# Altium footprint library Elettronica FM.PcbLib: 387 footprints (part 21 of 25)
Each footprint in its own frame and in the unit in brackets; x right, y up, seen from the top. Pads: shape width x height; smd on the part's side, far side on the other; paste and mask are expansions set on the pad; w line width, h text height; cw(c..) or ccw(c..) is an arc to the next point about the centre after c.
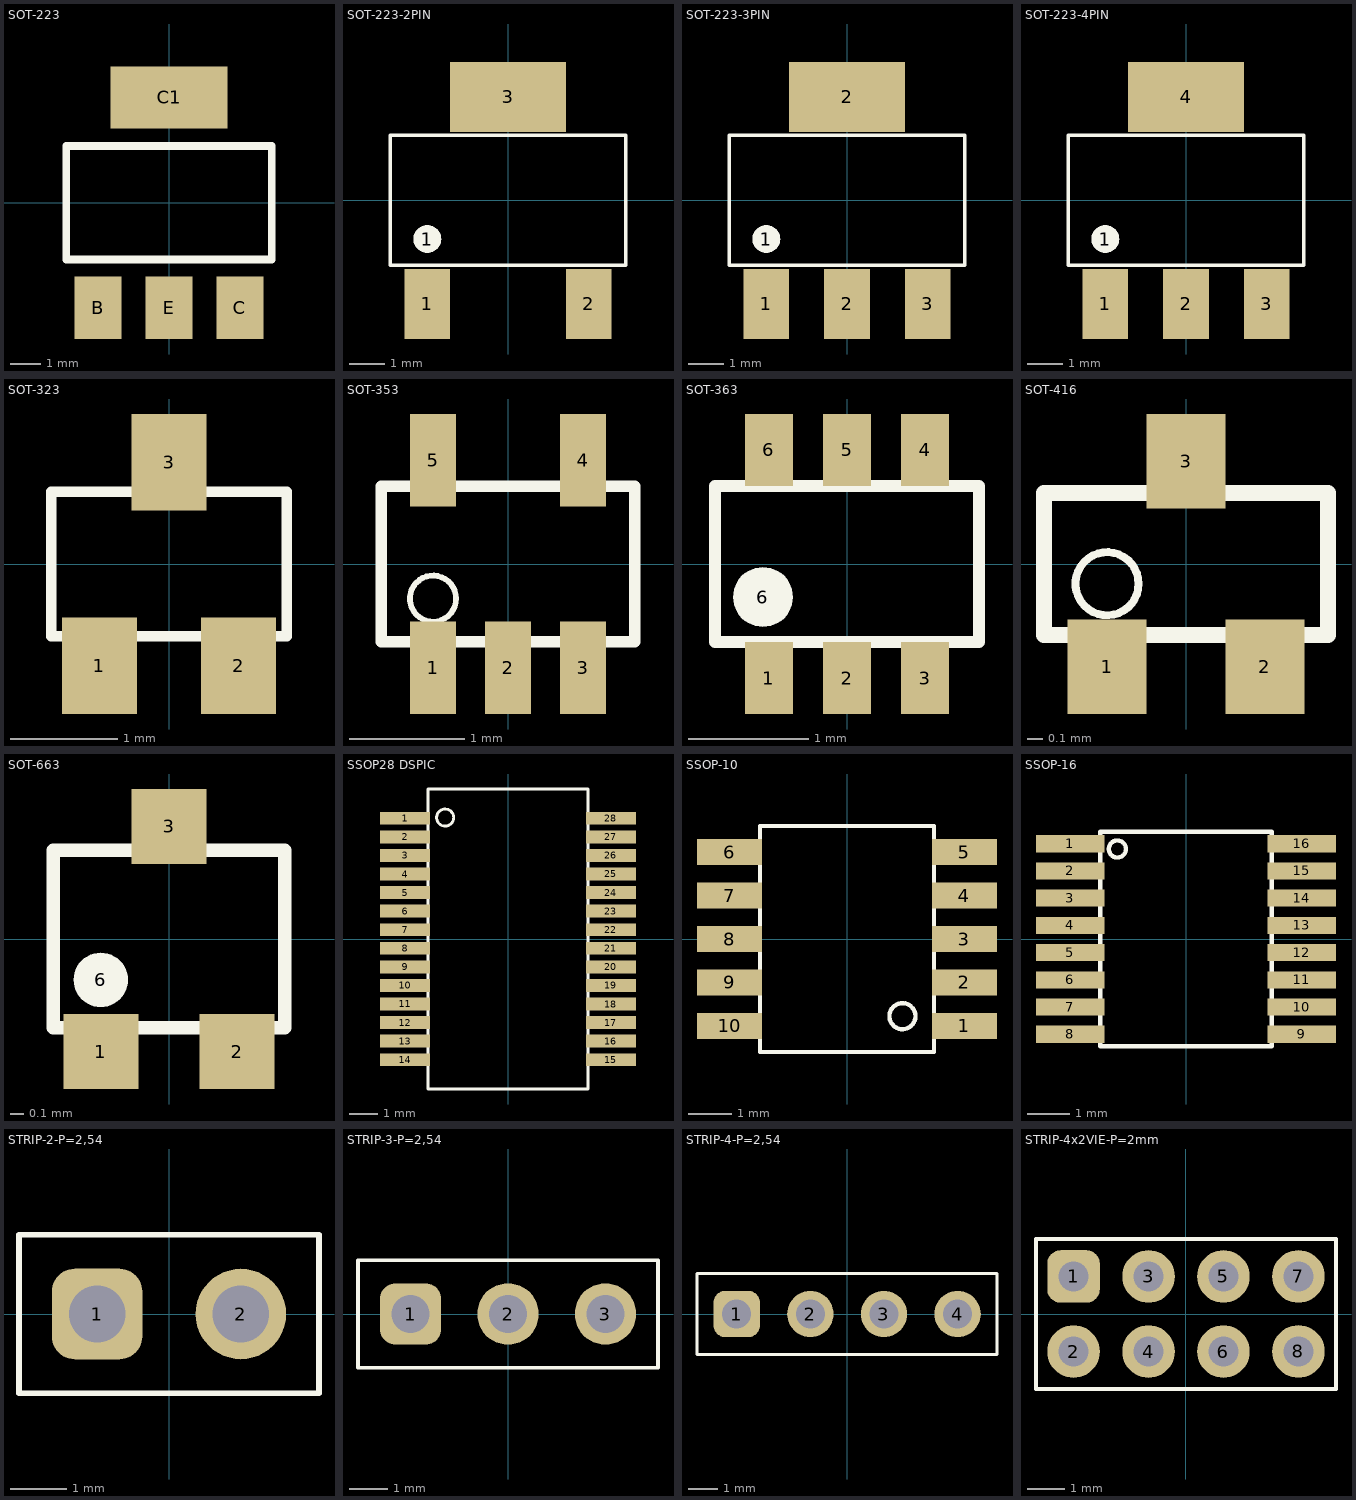
[diagram p20: the footprints below, top view; thin cyan lines are the x and y axes]

## SOT-223 [mil]
pads (4):
  rect 60x80 smd: B(-91,-135) C(91,-135) E(0,-135)
  rect 150x80 smd: C1(0,135)
Top Overlay:
  lines w10: -131.89,-72.83 131.89,-72.83 131.89,72.83 -131.89,72.83 -131.89,-72.83

## SOT-223-2PIN [mm]
pads (4):
  rect 1.3x2 smd: 1(-2.3,-2.95) 2(2.3,-2.95)
  round 0.8 on Top Overlay mask+0.1: 1(-2.3,-1.1)
  rect 3.3x2 smd: 3(0,2.95)
Top Overlay:
  lines w0.1: -3.35,-1.85 -3.35,1.85 3.35,1.85 3.35,-1.85 -3.35,-1.85
3D body: height 1.8, standoff 0, extent -3.35,-1.85 3.35,1.85

## SOT-223-3PIN [mm]
pads (5):
  rect 1.3x2 smd: 1(-2.3,-2.95) 2(0,-2.95) 3(2.3,-2.95)
  round 0.8 on Top Overlay mask+0.1: 1(-2.3,-1.1)
  rect 3.3x2 smd: 2(0,2.95)
Top Overlay:
  lines w0.1: -3.35,-1.85 3.35,-1.85 3.35,1.85 -3.35,1.85 -3.35,-1.85
3D body: height 1.8, standoff 0, extent -3.35,-1.85 3.35,1.85

## SOT-223-4PIN [mm]
pads (5):
  rect 1.3x2 smd: 1(-2.3,-2.95) 2(0,-2.95) 3(2.3,-2.95)
  round 0.8 on Top Overlay mask+0.1: 1(-2.3,-1.1)
  rect 3.3x2 smd: 4(0,2.95)
Top Overlay:
  lines w0.1: -3.35,-1.85 3.35,-1.85 3.35,1.85 -3.35,1.85 -3.35,-1.85
3D body: height 1.8, standoff 0, extent -3.35,-1.85 3.35,1.85

## SOT-323 [mm]
height 40.5
pads (3):
  rect 0.7x0.9 smd paste-0.05: 1(-0.65,-0.95) 2(0.65,-0.95) 3(0,0.95)
Top Overlay:
  lines w0.1: -1.1,-0.675 -1.1,0.675 1.1,0.675 1.1,-0.675 -1.1,-0.675
3D body "SOT323 (SC70-3).stp": height 1.1, standoff 0, extent -1.1,-1.123 1.1,1.123

## SOT-353 [mm]
pads (5):
  rect 0.4x0.8 smd: 1(-0.65,-0.9) 2(0,-0.9) 3(0.65,-0.9) 4(0.65,0.9) 5(-0.65,0.9)
Top Overlay:
  circle w0.05: c-0.65,-0.3 r0.2
  lines w0.1: -1.1,-0.675 1.1,-0.675 1.1,0.675 -1.1,0.675 -1.1,-0.675
3D body: height 1.1, standoff 0, extent -1.1,-0.675 1.1,0.675

## SOT-363 [mm]
pads (7):
  rect 0.4x0.6 smd: 1(-0.65,-0.95) 2(0,-0.95) 3(0.65,-0.95) 4(0.65,0.95) 5(0,0.95) 6(-0.65,0.95)
  round 0.5 on Top Overlay mask+0.1: 6(-0.7,-0.275)
Top Overlay:
  lines w0.1: -1.1,-0.65 -1.1,0.65 1.1,0.65 1.1,-0.65 -1.1,-0.65
3D body: height 1.1, standoff 0, extent -1.1,-0.65 1.1,0.65

## SOT-416 [mm]
pads (3):
  rect 0.5x0.6 smd: 1(-0.5,-0.65) 2(0.5,-0.65) 3(0,0.65)
Top Overlay:
  circle w0.05: c-0.5,-0.125 r0.2
  lines w0.1: -0.9,-0.45 0.9,-0.45 0.9,0.45 -0.9,0.45 -0.9,-0.45

## SOT-663 [mm]
pads (4):
  rect 0.55x0.55 smd: 1(-0.5,-0.825) 2(0.5,-0.825) 3(0,0.825)
  round 0.4 on Top Overlay mask+0.1: 6(-0.5,-0.3)
Top Overlay:
  lines w0.1: -0.85,-0.65 -0.85,0.65 0.85,0.65 0.85,-0.65 -0.85,-0.65
3D body: height 0.6, standoff 0, extent -0.85,-0.65 0.85,0.65

## SSOP28 DSPIC [mm]
height 1.85
pads (28):
  rect 1.75x0.45 smd paste-0.05: 1(-3.6,4.225) 2(-3.6,3.575) 3(-3.6,2.925) 4(-3.6,2.275) 5(-3.6,1.625) 6(-3.6,0.975) 7(-3.6,0.325) 8(-3.6,-0.325) 9(-3.6,-0.975) 10(-3.6,-1.625) 11(-3.6,-2.275) 12(-3.6,-2.925) 13(-3.6,-3.575) 14(-3.6,-4.225) 15(3.6,-4.225) 16(3.6,-3.575) 17(3.6,-2.925) 18(3.6,-2.275) 19(3.6,-1.625) 20(3.6,-0.975) 21(3.6,-0.325) 22(3.6,0.325) 23(3.6,0.975) 24(3.6,1.625) 25(3.6,2.275) 26(3.6,2.925) 27(3.6,3.575) 28(3.6,4.225)
Top Overlay:
  circle w0.1: c-2.2,4.25 r0.3
  lines w0.1: -2.8,-5.25 -2.8,5.25 2.8,5.25 2.8,-5.25 -2.8,-5.25
3D body: height 2, standoff 0, extent -2.8,-5.25 2.8,5.25

## SSOP-10 [mm] "SOP, 10-Leads, Body 5,0x4,0mm (max), Pitch 1,00mm, IPC High Density"
height 1.75
pads (10):
  rect 1.5x0.6 smd paste-0.05: 1(2.7,-2) 2(2.7,-1) 3(2.7,0) 4(2.7,1) 5(2.7,2) 6(-2.7,2) 7(-2.7,1) 8(-2.7,0) 9(-2.7,-1) 10(-2.7,-2)
Top Overlay:
  circle w0.1: c1.275,-1.775 r0.3
  lines w0.1: -2,-2.6 2,-2.6 2,2.6 -2,2.6 -2,-2.6
3D body: height 1.8, standoff 0, extent 0.975,-2.075 1.573,-1.476
3D body: height 1.75, standoff 0, extent -2,-2.6 2,2.6
3D body "SOP100P600X175-10.STEP": height 1.75, standoff 0.01, extent -3,-2.413 3,2.487

## SSOP-16 [mm]
pads (16):
  rect 1.6x0.4 smd mask+0.05: 1(-2.7,2.222) 2(-2.7,1.587) 3(-2.7,0.953) 4(-2.7,0.318) 5(-2.7,-0.318) 6(-2.7,-0.953) 7(-2.7,-1.587) 8(-2.7,-2.222) 9(2.7,-2.222) 10(2.7,-1.587) 11(2.7,-0.953) 12(2.7,-0.318) 13(2.7,0.318) 14(2.7,0.953) 15(2.7,1.587) 16(2.7,2.222)
Top Overlay:
  circle w0.1: c-1.6,2.1 r0.2
  lines w0.1: -2,-2.5 -2,2.5 2,2.5 2,-2.5 -2,-2.5
3D body: height 1.75, standoff 0, extent -2,-2.5 2,2.5

## STRIP-2-P=2,54 [mm]
pads (2):
  rrect50% 1.6x1.6 hole 1: 1(-1.27,0)
  round 1.6 hole 1: 2(1.27,0)
Top Overlay:
  lines w0.1: -2.65,-1.4 2.65,-1.4 2.65,1.4 -2.65,1.4 -2.65,-1.4
  text "1" at -1.415,-0.475 h1

## STRIP-3-P=2,54 [mm]
pads (3):
  rrect50% 1.6x1.6 hole 1: 1(-2.54,0)
  round 1.6 hole 1: 2(0,0) 3(2.54,0)
Top Overlay:
  lines w0.1: -3.91,-1.4 3.91,-1.4 3.91,1.4 -3.91,1.4 -3.91,-1.4
  text "1" at -2.685,-0.475 h1

## STRIP-4-P=2,54 [mm]
pads (4):
  rrect50% 1.6x1.6 hole 1: 1(-3.81,0)
  round 1.6 hole 1: 2(-1.27,0) 3(1.27,0) 4(3.81,0)
Top Overlay:
  lines w0.1: -5.18,-1.4 -5.18,1.4 5.17,1.4 5.17,-1.4 -5.18,-1.4
  text "1" at -3.955,-0.475 h1

## STRIP-4x2VIE-P=2mm [mm]
height 1.7
pads (8):
  rrect50% 1.4x1.4 hole 0.8: 1(-3,1)
  round 1.4 hole 0.8: 2(-3,-1) 3(-1,1) 4(-1,-1) 5(1,1) 6(1,-1) 7(3,1) 8(3,-1)
Top Overlay:
  lines w0.1: -4,-2 4,-2 4,2 -4,2 -4,-2
  text "1" at -3.1,0.7 h0.6
  text "2" at -3.2,-1.275 h0.6
  text "7" at 2.8,0.7 h0.6
  text "8" at 2.8,-1.3 h0.6
3D body: height 8.7, standoff -2.8, extent 2.75,0.75 3.25,1.25
3D body: height 8.7, standoff -2.8, extent 0.75,0.75 1.25,1.25
3D body: height 8.7, standoff -2.8, extent -1.25,0.75 -0.75,1.25
3D body: height 8.7, standoff -2.8, extent -3.25,0.75 -2.75,1.25
3D body: height 2, standoff 0, extent -4,-2 4,2
3D body: height 8.7, standoff -2.8, extent -3.25,-1.25 -2.75,-0.75
3D body: height 8.7, standoff -2.8, extent -1.25,-1.25 -0.75,-0.75
3D body: height 8.7, standoff -2.8, extent 0.75,-1.25 1.25,-0.75
3D body: height 8.7, standoff -2.8, extent 2.75,-1.25 3.25,-0.75